# Altium footprint library tinyCamera.PcbLib: 101 footprints (part 4 of 7)
Each footprint in its own frame and in the unit in brackets; x right, y up, seen from the top. Pads: shape width x height; smd on the part's side, far side on the other; paste and mask are expansions set on the pad; w line width, h text height; cw(c..) or ccw(c..) is an arc to the next point about the centre after c.
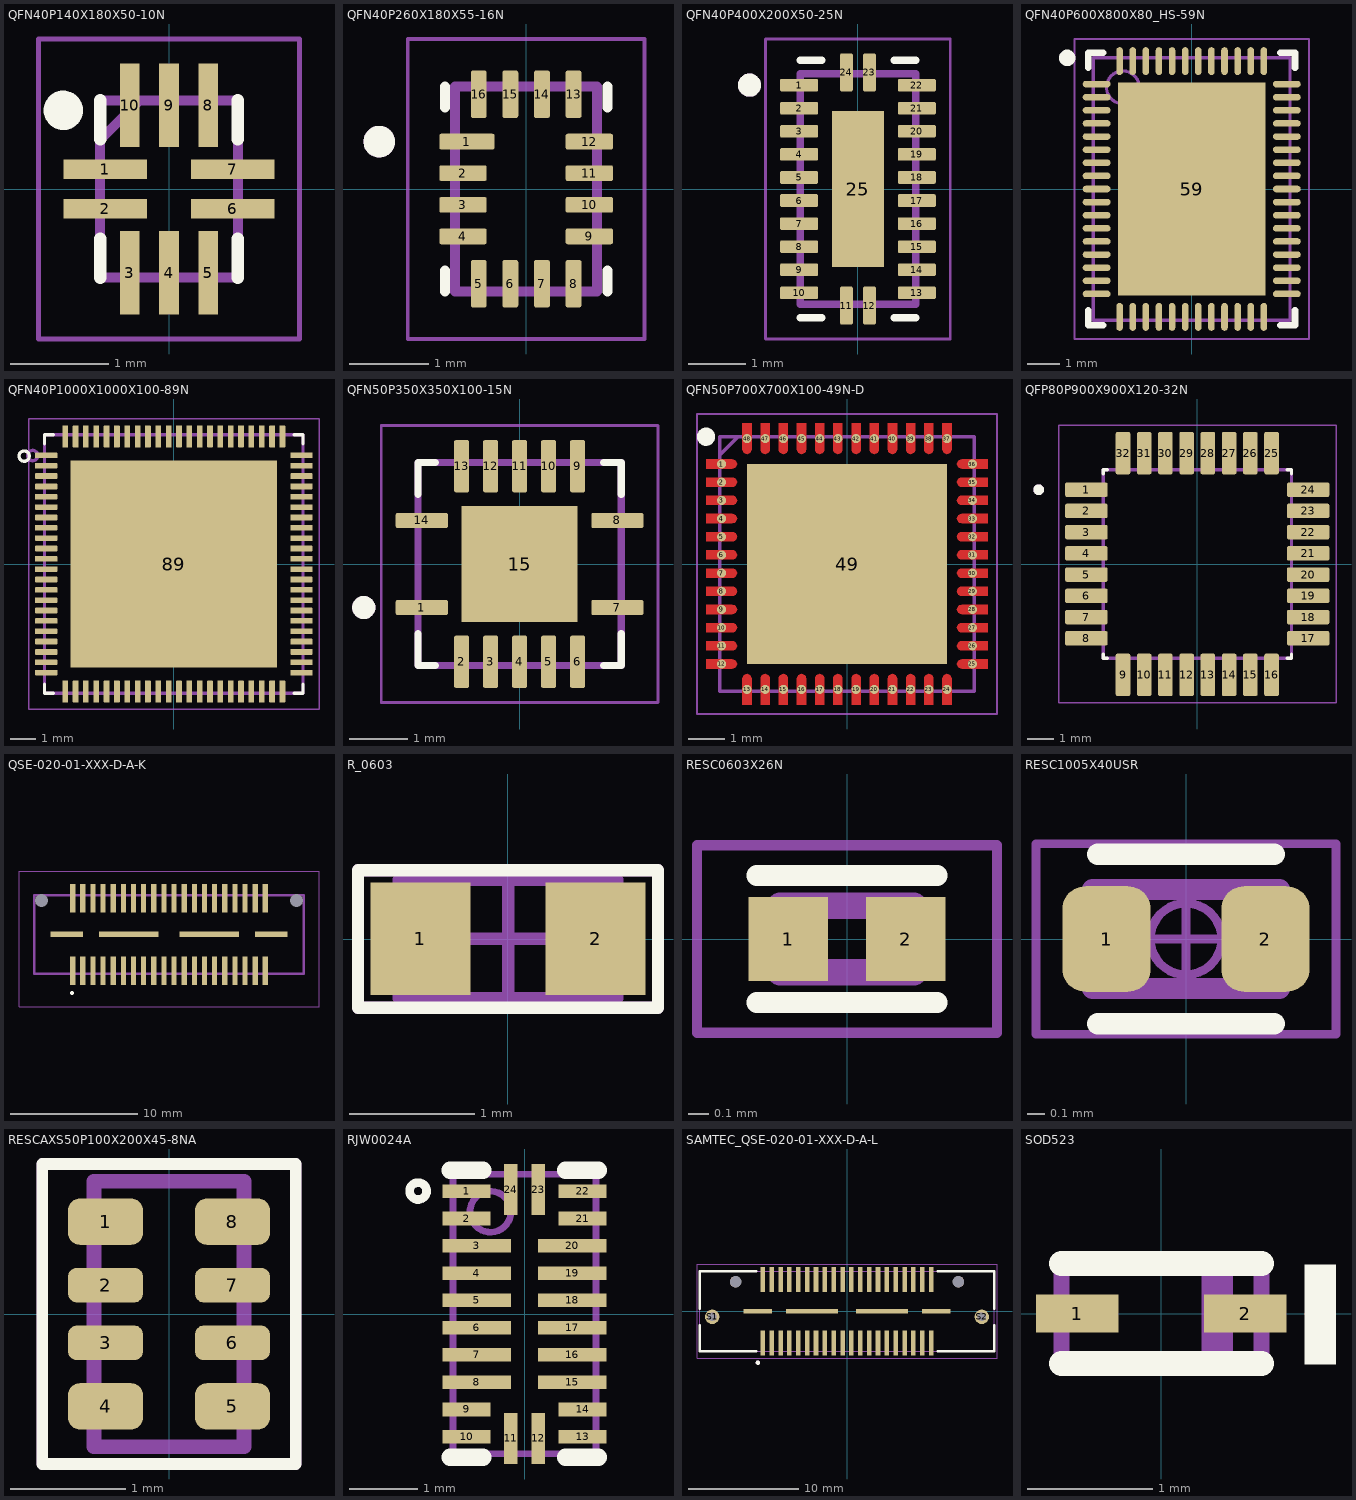
[diagram p3: the footprints below, top view; thin cyan lines are the x and y axes]

## QFN40P140X180X50-10N [mm]
pads (10):
  rect 0.85x0.2 smd mask+0.051: 1(-0.65,0.2) 2(-0.65,-0.2) 6(0.65,-0.2) 7(0.65,0.2)
  rect 0.2x0.85 smd mask+0.051: 3(-0.4,-0.85) 4(0,-0.85) 5(0.4,-0.85) 8(0.4,0.85) 9(0,0.85) 10(-0.4,0.85)
Top Overlay:
  circle w0.2: c-1.075,0.8 r0.1
  lines w0.127: -0.7,-0.9 -0.7,-0.508 ; -0.7,0.508 -0.7,0.9 ; 0.7,-0.9 0.7,-0.508 ; 0.7,0.508 0.7,0.9
Mechanical 13:
  lines w0.1: -0.7,0.5 -0.3,0.9 ; -0.7,-0.9 -0.7,0.9 0.7,0.9 0.7,-0.9 -0.7,-0.9
  text ".Designator" at -0.383,-0.157 h1.27
Mechanical 20:
  lines w0.05: -1.325,-1.525 1.325,-1.525 1.325,1.525 -1.325,1.525 -1.325,-1.525
3D body "74AVC1T1022GUX.stp": height 0.49, standoff 0.01, extent -0.7,-0.9 0.7,0.9

## QFN40P260X180X55-16N [mm]
pads (16):
  rrect25% 0.7x0.2 smd mask+0.051: 1(-0.75,0.6)
  rrect25% 0.6x0.2 smd mask+0.051: 2(-0.8,0.2) 3(-0.8,-0.2) 4(-0.8,-0.6) 9(0.8,-0.6) 10(0.8,-0.2) 11(0.8,0.2) 12(0.8,0.6)
  rrect25% 0.2x0.6 smd mask+0.051: 5(-0.6,-1.2) 6(-0.2,-1.2) 7(0.2,-1.2) 8(0.6,-1.2) 13(0.6,1.2) 14(0.2,1.2) 15(-0.2,1.2) 16(-0.6,1.2)
Top Overlay:
  circle w0.2: c-1.86,0.6 r0.1
  lines w0.127: -1.03,-1.3 -1.03,-1.03 ; -1.03,1.03 -1.03,1.3 ; 1.03,-1.3 1.03,-1.03 ; 1.03,1.03 1.03,1.3
Mechanical 13:
  circle w0.2: c-1.86,0.6 r0.1
  lines w0.127: -0.9,-1.3 -0.9,1.3 0.9,1.3 0.9,-1.3 -0.9,-1.3
  text ".Designator" at -0.24,-0.38 h1.27
Mechanical 15:
  lines w0.05: -1.5,-1.9 -1.5,1.9 1.5,1.9 1.5,-1.9 -1.5,-1.9
3D body "step_temp.STEP": height 0.55, standoff 0, extent -0.9,-1.3 0.9,1.3

## QFN40P400X200X50-25N [mm]
pads (25):
  rrect25% 0.66x0.22 smd mask+0.051: 1(-1.02,1.8) 2(-1.02,1.4) 3(-1.02,1) 4(-1.02,0.6) 5(-1.02,0.2) 6(-1.02,-0.2) 7(-1.02,-0.6) 8(-1.02,-1) 9(-1.02,-1.4) 10(-1.02,-1.8) 13(1.02,-1.8) 14(1.02,-1.4) 15(1.02,-1) 16(1.02,-0.6) 17(1.02,-0.2) 18(1.02,0.2) 19(1.02,0.6) 20(1.02,1) 21(1.02,1.4) 22(1.02,1.8)
  rrect25% 0.22x0.66 smd mask+0.051: 11(-0.2,-2.02) 12(0.2,-2.02) 23(0.2,2.02) 24(-0.2,2.02)
  rect 0.9x2.7 smd paste-2 mask+0.051: 25(0,0)
Top Overlay:
  circle w0.2: c-1.88,1.8 r0.1
  lines w0.127: -1,-2.23 -0.63,-2.23 ; -1,2.23 -0.63,2.23 ; 0.63,-2.23 1,-2.23 ; 0.63,2.23 1,2.23
Top Paste:
  region: -0.075,-0.825 -0.375,-0.825 -0.375,-0.525 -0.075,-0.525
  region: -0.075,-1.275 -0.375,-1.275 -0.375,-0.975 -0.075,-0.975
  region: 0.375,-1.275 0.075,-1.275 0.075,-0.975 0.375,-0.975
  region: 0.375,-0.825 0.075,-0.825 0.075,-0.525 0.375,-0.525
  region: 0.375,0.975 0.075,0.975 0.075,1.275 0.375,1.275
  region: 0.375,0.525 0.075,0.525 0.075,0.825 0.375,0.825
  region: -0.075,0.975 -0.375,0.975 -0.375,1.275 -0.075,1.275
  region: -0.075,0.525 -0.375,0.525 -0.375,0.825 -0.075,0.825
  region: -0.075,-0.375 -0.375,-0.375 -0.375,-0.075 -0.075,-0.075
  region: 0.375,-0.375 0.075,-0.375 0.075,-0.075 0.375,-0.075
  region: 0.375,0.075 0.075,0.075 0.075,0.375 0.375,0.375
  region: -0.075,0.075 -0.375,0.075 -0.375,0.375 -0.075,0.375
Mechanical 13:
  circle w0.2: c-1.88,1.8 r0.1
  lines w0.127: -1,-2 -1,2 1,2 1,-2 -1,-2
  text ".Designator" at -0.644,-0.31 h1.27
Mechanical 15:
  lines w0.05: -1.6,-2.6 -1.6,2.6 1.6,2.6 1.6,-2.6 -1.6,-2.6
3D body "step_temp.STEP": height 0.5, standoff 0, extent -1,-2 1,2

## QFN40P600X800X80_HS-59N [mm] "QFN, 58-Leads, Body 6.00x8.00mm, Pitch 0.40mm, Thermal Pad 4.50x6.50mm, IPC Medium Density"
height 0.8
pads (59):
  oval 0.85x0.2 smd: 1(-2.9,3.2) 2(-2.9,2.8) 3(-2.9,2.4) 4(-2.9,2) 5(-2.9,1.6) 6(-2.9,1.2) 7(-2.9,0.8) 8(-2.9,0.4) 9(-2.9,0) 10(-2.9,-0.4) 11(-2.9,-0.8) 12(-2.9,-1.2) 13(-2.9,-1.6) 14(-2.9,-2) 15(-2.9,-2.4) 16(-2.9,-2.8) 17(-2.9,-3.2) 30(2.9,-3.2) 31(2.9,-2.8) 32(2.9,-2.4) 33(2.9,-2) 34(2.9,-1.6) 35(2.9,-1.2) 36(2.9,-0.8) 37(2.9,-0.4) 38(2.9,0) 39(2.9,0.4) 40(2.9,0.8) 41(2.9,1.2) 42(2.9,1.6) 43(2.9,2) 44(2.9,2.4) 45(2.9,2.8) 46(2.9,3.2)
  oval 0.2x0.85 smd: 18(-2.2,-3.9) 19(-1.8,-3.9) 20(-1.4,-3.9) 21(-1,-3.9) 22(-0.6,-3.9) 23(-0.2,-3.9) 24(0.2,-3.9) 25(0.6,-3.9) 26(1,-3.9) 27(1.4,-3.9) 28(1.8,-3.9) 29(2.2,-3.9) 47(2.2,3.9) 48(1.8,3.9) 49(1.4,3.9) 50(1,3.9) 51(0.6,3.9) 52(0.2,3.9) 53(-0.2,3.9) 54(-0.6,3.9) 55(-1,3.9) 56(-1.4,3.9) 57(-1.8,3.9) 58(-2.2,3.9)
  rect 4.5x6.5 smd: 59(0,0)
Top Overlay:
  circle w0.25: c-3.8,4 r0.125
  lines w0.2: -3.15,-3.7 -3.15,-4.15 -2.7,-4.15 ; -3.15,3.7 -3.15,4.15 -2.7,4.15 ; 2.7,-4.15 3.15,-4.15 3.15,-3.7 ; 2.7,4.15 3.15,4.15 3.15,3.7
Top Courtyard:
  lines w0.05: -3.575,-4.575 3.575,-4.575 3.575,4.575 -3.575,4.575 -3.575,-4.575
  lines w0.1: -0.5,0 0.5,0 ; 0,-0.5 0,0.5
Mechanical 13:
  circle w0.1: c-2.1,3.1 r0.5
  lines w0.1: -3,-4 3,-4 3,4 -3,4 -3,-4
  text ".Designator" at -2.068,-0.367 h1.27
3D body "QFN40P600X800X80_HS-59N.step": height 0.8, standoff 0, extent -3.01,-4.01 3.01,4.01

## QFN40P1000X1000X100-89N [mm]
pads (89):
  rrect25% 0.86x0.22 smd mask+0.05: 1(-4.935,4.2) 2(-4.935,3.8) 3(-4.935,3.4) 4(-4.935,3) 5(-4.935,2.6) 6(-4.935,2.2) 7(-4.935,1.8) 8(-4.935,1.4) 9(-4.935,1) 10(-4.935,0.6) 11(-4.935,0.2) 12(-4.935,-0.2) 13(-4.935,-0.6) 14(-4.935,-1) 15(-4.935,-1.4) 16(-4.935,-1.8) 17(-4.935,-2.2) 18(-4.935,-2.6) 19(-4.935,-3) 20(-4.935,-3.4) 21(-4.935,-3.8) 22(-4.935,-4.2) 45(4.935,-4.2) 46(4.935,-3.8) 47(4.935,-3.4) 48(4.935,-3) 49(4.935,-2.6) 50(4.935,-2.2) 51(4.935,-1.8) 52(4.935,-1.4) 53(4.935,-1) 54(4.935,-0.6) 55(4.935,-0.2) 56(4.935,0.2) 57(4.935,0.6) 58(4.935,1) 59(4.935,1.4) 60(4.935,1.8) 61(4.935,2.2) 62(4.935,2.6) 63(4.935,3) 64(4.935,3.4) 65(4.935,3.8) 66(4.935,4.2)
  rrect25% 0.22x0.86 smd mask+0.05: 23(-4.2,-4.935) 24(-3.8,-4.935) 25(-3.4,-4.935) 26(-3,-4.935) 27(-2.6,-4.935) 28(-2.2,-4.935) 29(-1.8,-4.935) 30(-1.4,-4.935) 31(-1,-4.935) 32(-0.6,-4.935) 33(-0.2,-4.935) 34(0.2,-4.935) 35(0.6,-4.935) 36(1,-4.935) 37(1.4,-4.935) 38(1.8,-4.935) 39(2.2,-4.935) 40(2.6,-4.935) 41(3,-4.935) 42(3.4,-4.935) 43(3.8,-4.935) 44(4.2,-4.935) 67(4.2,4.935) 68(3.8,4.935) 69(3.4,4.935) 70(3,4.935) 71(2.6,4.935) 72(2.2,4.935) 73(1.8,4.935) 74(1.4,4.935) 75(1,4.935) 76(0.6,4.935) 77(0.2,4.935) 78(-0.2,4.935) 79(-0.6,4.935) 80(-1,4.935) 81(-1.4,4.935) 82(-1.8,4.935) 83(-2.2,4.935) 84(-2.6,4.935) 85(-3,4.935) 86(-3.4,4.935) 87(-3.8,4.935) 88(-4.2,4.935)
  rect 8x8 smd paste-4 mask+0.05: 89(0,0)
Top Overlay:
  circle w0.127: c-5.787,4.173 r0.2
  lines w0.127: -5,-4.65 -5,-5 -4.65,-5 ; -5,4.65 -5,5 -4.65,5 ; 4.65,-5 5,-5 5,-4.65 ; 4.65,5 5,5 5,4.65
Top Paste:
  region: 2.3,-2.3 0.34,-2.3 0.34,-0.34 2.3,-0.34
  region: -0.34,-2.3 -2.3,-2.3 -2.3,-0.34 -0.34,-0.34
  region: -0.34,0.34 -2.3,0.34 -2.3,2.3 -0.34,2.3
  region: 2.3,0.34 0.34,0.34 0.34,2.3 2.3,2.3
Mechanical 13:
  circle w0.127: c-5.46,4.194 r0.2
  lines w0.127: -5,-5 -5,5 5,5 5,-5 -5,-5
  text ".Designator" at -0.997,-0.392 h1.27
Mechanical 15:
  lines w0.05: -5.615,-5.615 -5.615,5.615 5.615,5.615 5.615,-5.615 -5.615,-5.615
3D body "User Library-QFN88.step": height 0.85, standoff -0.02, extent -5.01,-5.01 5.01,5.01

## QFN50P350X350X100-15N [mm]
pads (15):
  rrect25% 0.9x0.26 smd mask+0.051: 1(-1.685,-0.75) 7(1.685,-0.75) 8(1.685,0.75) 14(-1.685,0.75)
  rrect25% 0.26x0.9 smd mask+0.051: 2(-1,-1.685) 3(-0.5,-1.685) 4(0,-1.685) 5(0.5,-1.685) 6(1,-1.685) 9(1,1.685) 10(0.5,1.685) 11(0,1.685) 12(-0.5,1.685) 13(-1,1.685)
  rect 2x2 smd paste-2: 15(0,0)
Top Overlay:
  circle w0.2: c-2.685,-0.75 r0.1
  lines w0.127: -1.75,-1.2 -1.75,-1.75 -1.45,-1.75 ; -1.75,1.2 -1.75,1.75 -1.45,1.75 ; 1.45,-1.75 1.75,-1.75 1.75,-1.2 ; 1.45,1.75 1.75,1.75 1.75,1.2
Top Paste:
  region: 0.63,-0.63 -0.63,-0.63 -0.63,0.63 0.63,0.63
Mechanical 13:
  circle w0.2: c-2.685,-0.75 r0.1
  lines w0.127: -1.75,-1.75 1.75,-1.75 1.75,1.75 -1.75,1.75 -1.75,-1.75
  text ".Designator" at 0.587,-0.356 h1.27
Mechanical 15:
  lines w0.05: -2.385,-2.385 2.385,-2.385 2.385,2.385 -2.385,2.385 -2.385,-2.385
3D body "SN74LV4T125RGYR.STEP": height 1, standoff 0, extent -1.75,-1.75 1.75,1.75

## QFN50P700X700X100-49N-D [mm]
pads (49):
  round 0.25 smd mask+0: 1(-3.45,2.75) 2(-3.45,2.25) 3(-3.45,1.75) 4(-3.45,1.25) 5(-3.45,0.75) 6(-3.45,0.25) 7(-3.45,-0.25) 8(-3.45,-0.75) 9(-3.45,-1.25) 10(-3.45,-1.75) 11(-3.45,-2.25) 12(-3.45,-2.75) 13(-2.75,-3.45) 14(-2.25,-3.45) 15(-1.75,-3.45) 16(-1.25,-3.45) 17(-0.75,-3.45) 18(-0.25,-3.45) 19(0.25,-3.45) 20(0.75,-3.45) 21(1.25,-3.45) 22(1.75,-3.45) 23(2.25,-3.45) 24(2.75,-3.45) 25(3.45,-2.75) 26(3.45,-2.25) 27(3.45,-1.75) 28(3.45,-1.25) 29(3.45,-0.75) 30(3.45,-0.25) 31(3.45,0.25) 32(3.45,0.75) 33(3.45,1.25) 34(3.45,1.75) 35(3.45,2.25) 36(3.45,2.75) 37(2.75,3.45) 38(2.25,3.45) 39(1.75,3.45) 40(1.25,3.45) 41(0.75,3.45) 42(0.25,3.45) 43(-0.25,3.45) 44(-0.75,3.45) 45(-1.25,3.45) 46(-1.75,3.45) 47(-2.25,3.45) 48(-2.75,3.45)
  rrect0% 5.5x5.5 smd mask+0.051: 49(0,0)
Top Layer:
  region: -3.875,2.875 -3.15,2.876 -3.117,2.872 -3.087,2.859 -3.061,2.839 -3.041,2.813 -3.028,2.783 -3.024,2.75 -3.028,2.717 -3.041,2.687 -3.061,2.661 -3.087,2.641 -3.117,2.628 -3.15,2.624 -3.15,2.625 -3.875,2.625
  region: -3.875,2.375 -3.15,2.376 -3.117,2.372 -3.087,2.359 -3.061,2.339 -3.041,2.313 -3.028,2.283 -3.024,2.25 -3.028,2.217 -3.041,2.187 -3.061,2.161 -3.087,2.141 -3.117,2.128 -3.15,2.124 -3.15,2.125 -3.875,2.125
  region: -3.875,1.875 -3.15,1.876 -3.117,1.872 -3.087,1.859 -3.061,1.839 -3.041,1.813 -3.028,1.783 -3.024,1.75 -3.028,1.717 -3.041,1.687 -3.061,1.661 -3.087,1.641 -3.117,1.628 -3.15,1.624 -3.15,1.625 -3.875,1.625
  region: -3.875,1.375 -3.15,1.376 -3.117,1.372 -3.087,1.359 -3.061,1.339 -3.041,1.313 -3.028,1.283 -3.024,1.25 -3.028,1.217 -3.041,1.187 -3.061,1.161 -3.087,1.141 -3.117,1.128 -3.15,1.124 -3.15,1.125 -3.875,1.125
  region: -3.875,0.875 -3.15,0.876 -3.117,0.872 -3.087,0.859 -3.061,0.839 -3.041,0.813 -3.028,0.783 -3.024,0.75 -3.028,0.717 -3.041,0.687 -3.061,0.661 -3.087,0.641 -3.117,0.628 -3.15,0.624 -3.15,0.625 -3.875,0.625
  region: -3.875,0.375 -3.15,0.376 -3.117,0.372 -3.087,0.359 -3.061,0.339 -3.041,0.313 -3.028,0.283 -3.024,0.25 -3.028,0.217 -3.041,0.187 -3.061,0.161 -3.087,0.141 -3.117,0.128 -3.15,0.124 -3.15,0.125 -3.875,0.125
  region: -3.875,-0.125 -3.15,-0.124 -3.117,-0.128 -3.087,-0.141 -3.061,-0.161 -3.041,-0.187 -3.028,-0.217 -3.024,-0.25 -3.028,-0.283 -3.041,-0.313 -3.061,-0.339 -3.087,-0.359 -3.117,-0.372 -3.15,-0.376 -3.15,-0.375 -3.875,-0.375
  region: -3.875,-0.625 -3.15,-0.624 -3.117,-0.628 -3.087,-0.641 -3.061,-0.661 -3.041,-0.687 -3.028,-0.717 -3.024,-0.75 -3.028,-0.783 -3.041,-0.813 -3.061,-0.839 -3.087,-0.859 -3.117,-0.872 -3.15,-0.876 -3.15,-0.875 -3.875,-0.875
  region: -3.875,-1.125 -3.15,-1.124 -3.117,-1.128 -3.087,-1.141 -3.061,-1.161 -3.041,-1.187 -3.028,-1.217 -3.024,-1.25 -3.028,-1.283 -3.041,-1.313 -3.061,-1.339 -3.087,-1.359 -3.117,-1.372 -3.15,-1.376 -3.15,-1.375 -3.875,-1.375
  region: -3.875,-1.625 -3.15,-1.624 -3.117,-1.628 -3.087,-1.641 -3.061,-1.661 -3.041,-1.687 -3.028,-1.717 -3.024,-1.75 -3.028,-1.783 -3.041,-1.813 -3.061,-1.839 -3.087,-1.859 -3.117,-1.872 -3.15,-1.876 -3.15,-1.875 -3.875,-1.875
  region: -3.875,-2.125 -3.15,-2.124 -3.117,-2.128 -3.087,-2.141 -3.061,-2.161 -3.041,-2.187 -3.028,-2.217 -3.024,-2.25 -3.028,-2.283 -3.041,-2.313 -3.061,-2.339 -3.087,-2.359 -3.117,-2.372 -3.15,-2.376 -3.15,-2.375 -3.875,-2.375
  region: -3.875,-2.625 -3.15,-2.624 -3.117,-2.628 -3.087,-2.641 -3.061,-2.661 -3.041,-2.687 -3.028,-2.717 -3.024,-2.75 -3.028,-2.783 -3.041,-2.813 -3.061,-2.839 -3.087,-2.859 -3.117,-2.872 -3.15,-2.876 -3.15,-2.875 -3.875,-2.875
  region: -2.875,-3.875 -2.876,-3.15 -2.872,-3.117 -2.859,-3.087 -2.839,-3.061 -2.813,-3.041 -2.783,-3.028 -2.75,-3.024 -2.717,-3.028 -2.687,-3.041 -2.661,-3.061 -2.641,-3.087 -2.628,-3.117 -2.624,-3.15 -2.625,-3.15 -2.625,-3.875
  region: -2.375,-3.875 -2.376,-3.15 -2.372,-3.117 -2.359,-3.087 -2.339,-3.061 -2.313,-3.041 -2.283,-3.028 -2.25,-3.024 -2.217,-3.028 -2.187,-3.041 -2.161,-3.061 -2.141,-3.087 -2.128,-3.117 -2.124,-3.15 -2.125,-3.15 -2.125,-3.875
  region: -1.875,-3.875 -1.876,-3.15 -1.872,-3.117 -1.859,-3.087 -1.839,-3.061 -1.813,-3.041 -1.783,-3.028 -1.75,-3.024 -1.717,-3.028 -1.687,-3.041 -1.661,-3.061 -1.641,-3.087 -1.628,-3.117 -1.624,-3.15 -1.625,-3.15 -1.625,-3.875
  region: -1.375,-3.875 -1.376,-3.15 -1.372,-3.117 -1.359,-3.087 -1.339,-3.061 -1.313,-3.041 -1.283,-3.028 -1.25,-3.024 -1.217,-3.028 -1.187,-3.041 -1.161,-3.061 -1.141,-3.087 -1.128,-3.117 -1.124,-3.15 -1.125,-3.15 -1.125,-3.875
  region: -0.875,-3.875 -0.876,-3.15 -0.872,-3.117 -0.859,-3.087 -0.839,-3.061 -0.813,-3.041 -0.783,-3.028 -0.75,-3.024 -0.717,-3.028 -0.687,-3.041 -0.661,-3.061 -0.641,-3.087 -0.628,-3.117 -0.624,-3.15 -0.625,-3.15 -0.625,-3.875
  region: -0.375,-3.875 -0.376,-3.15 -0.372,-3.117 -0.359,-3.087 -0.339,-3.061 -0.313,-3.041 -0.283,-3.028 -0.25,-3.024 -0.217,-3.028 -0.187,-3.041 -0.161,-3.061 -0.141,-3.087 -0.128,-3.117 -0.124,-3.15 -0.125,-3.15 -0.125,-3.875
  region: 0.125,-3.875 0.124,-3.15 0.128,-3.117 0.141,-3.087 0.161,-3.061 0.187,-3.041 0.217,-3.028 0.25,-3.024 0.283,-3.028 0.313,-3.041 0.339,-3.061 0.359,-3.087 0.372,-3.117 0.376,-3.15 0.375,-3.15 0.375,-3.875
  region: 0.625,-3.875 0.624,-3.15 0.628,-3.117 0.641,-3.087 0.661,-3.061 0.687,-3.041 0.717,-3.028 0.75,-3.024 0.783,-3.028 0.813,-3.041 0.839,-3.061 0.859,-3.087 0.872,-3.117 0.876,-3.15 0.875,-3.15 0.875,-3.875
  region: 1.125,-3.875 1.124,-3.15 1.128,-3.117 1.141,-3.087 1.161,-3.061 1.187,-3.041 1.217,-3.028 1.25,-3.024 1.283,-3.028 1.313,-3.041 1.339,-3.061 1.359,-3.087 1.372,-3.117 1.376,-3.15 1.375,-3.15 1.375,-3.875
  region: 1.625,-3.875 1.624,-3.15 1.628,-3.117 1.641,-3.087 1.661,-3.061 1.687,-3.041 1.717,-3.028 1.75,-3.024 1.783,-3.028 1.813,-3.041 1.839,-3.061 1.859,-3.087 1.872,-3.117 1.876,-3.15 1.875,-3.15 1.875,-3.875
  region: 2.125,-3.875 2.124,-3.15 2.128,-3.117 2.141,-3.087 2.161,-3.061 2.187,-3.041 2.217,-3.028 2.25,-3.024 2.283,-3.028 2.313,-3.041 2.339,-3.061 2.359,-3.087 2.372,-3.117 2.376,-3.15 2.375,-3.15 2.375,-3.875
  region: 2.625,-3.875 2.624,-3.15 2.628,-3.117 2.641,-3.087 2.661,-3.061 2.687,-3.041 2.717,-3.028 2.75,-3.024 2.783,-3.028 2.813,-3.041 2.839,-3.061 2.859,-3.087 2.872,-3.117 2.876,-3.15 2.875,-3.15 2.875,-3.875
  region: 3.875,-2.875 3.15,-2.876 3.117,-2.872 3.087,-2.859 3.061,-2.839 3.041,-2.813 3.028,-2.783 3.024,-2.75 3.028,-2.717 3.041,-2.687 3.061,-2.661 3.087,-2.641 3.117,-2.628 3.15,-2.624 3.15,-2.625 3.875,-2.625
  region: 3.875,-2.375 3.15,-2.376 3.117,-2.372 3.087,-2.359 3.061,-2.339 3.041,-2.313 3.028,-2.283 3.024,-2.25 3.028,-2.217 3.041,-2.187 3.061,-2.161 3.087,-2.141 3.117,-2.128 3.15,-2.124 3.15,-2.125 3.875,-2.125
  region: 3.875,-1.875 3.15,-1.876 3.117,-1.872 3.087,-1.859 3.061,-1.839 3.041,-1.813 3.028,-1.783 3.024,-1.75 3.028,-1.717 3.041,-1.687 3.061,-1.661 3.087,-1.641 3.117,-1.628 3.15,-1.624 3.15,-1.625 3.875,-1.625
  region: 3.875,-1.375 3.15,-1.376 3.117,-1.372 3.087,-1.359 3.061,-1.339 3.041,-1.313 3.028,-1.283 3.024,-1.25 3.028,-1.217 3.041,-1.187 3.061,-1.161 3.087,-1.141 3.117,-1.128 3.15,-1.124 3.15,-1.125 3.875,-1.125
  region: 3.875,-0.875 3.15,-0.876 3.117,-0.872 3.087,-0.859 3.061,-0.839 3.041,-0.813 3.028,-0.783 3.024,-0.75 3.028,-0.717 3.041,-0.687 3.061,-0.661 3.087,-0.641 3.117,-0.628 3.15,-0.624 3.15,-0.625 3.875,-0.625
  region: 3.875,-0.375 3.15,-0.376 3.117,-0.372 3.087,-0.359 3.061,-0.339 3.041,-0.313 3.028,-0.283 3.024,-0.25 3.028,-0.217 3.041,-0.187 3.061,-0.161 3.087,-0.141 3.117,-0.128 3.15,-0.124 3.15,-0.125 3.875,-0.125
  region: 3.875,0.125 3.15,0.124 3.117,0.128 3.087,0.141 3.061,0.161 3.041,0.187 3.028,0.217 3.024,0.25 3.028,0.283 3.041,0.313 3.061,0.339 3.087,0.359 3.117,0.372 3.15,0.376 3.15,0.375 3.875,0.375
  region: 3.875,0.625 3.15,0.624 3.117,0.628 3.087,0.641 3.061,0.661 3.041,0.687 3.028,0.717 3.024,0.75 3.028,0.783 3.041,0.813 3.061,0.839 3.087,0.859 3.117,0.872 3.15,0.876 3.15,0.875 3.875,0.875
  region: 3.875,1.125 3.15,1.124 3.117,1.128 3.087,1.141 3.061,1.161 3.041,1.187 3.028,1.217 3.024,1.25 3.028,1.283 3.041,1.313 3.061,1.339 3.087,1.359 3.117,1.372 3.15,1.376 3.15,1.375 3.875,1.375
  region: 3.875,1.625 3.15,1.624 3.117,1.628 3.087,1.641 3.061,1.661 3.041,1.687 3.028,1.717 3.024,1.75 3.028,1.783 3.041,1.813 3.061,1.839 3.087,1.859 3.117,1.872 3.15,1.876 3.15,1.875 3.875,1.875
  region: 3.875,2.125 3.15,2.124 3.117,2.128 3.087,2.141 3.061,2.161 3.041,2.187 3.028,2.217 3.024,2.25 3.028,2.283 3.041,2.313 3.061,2.339 3.087,2.359 3.117,2.372 3.15,2.376 3.15,2.375 3.875,2.375
  region: 3.875,2.625 3.15,2.624 3.117,2.628 3.087,2.641 3.061,2.661 3.041,2.687 3.028,2.717 3.024,2.75 3.028,2.783 3.041,2.813 3.061,2.839 3.087,2.859 3.117,2.872 3.15,2.876 3.15,2.875 3.875,2.875
  region: 2.875,3.875 2.876,3.15 2.872,3.117 2.859,3.087 2.839,3.061 2.813,3.041 2.783,3.028 2.75,3.024 2.717,3.028 2.687,3.041 2.661,3.061 2.641,3.087 2.628,3.117 2.624,3.15 2.625,3.15 2.625,3.875
  region: 2.375,3.875 2.376,3.15 2.372,3.117 2.359,3.087 2.339,3.061 2.313,3.041 2.283,3.028 2.25,3.024 2.217,3.028 2.187,3.041 2.161,3.061 2.141,3.087 2.128,3.117 2.124,3.15 2.125,3.15 2.125,3.875
  region: 1.875,3.875 1.876,3.15 1.872,3.117 1.859,3.087 1.839,3.061 1.813,3.041 1.783,3.028 1.75,3.024 1.717,3.028 1.687,3.041 1.661,3.061 1.641,3.087 1.628,3.117 1.624,3.15 1.625,3.15 1.625,3.875
  region: 1.375,3.875 1.376,3.15 1.372,3.117 1.359,3.087 1.339,3.061 1.313,3.041 1.283,3.028 1.25,3.024 1.217,3.028 1.187,3.041 1.161,3.061 1.141,3.087 1.128,3.117 1.124,3.15 1.125,3.15 1.125,3.875
  region: 0.875,3.875 0.876,3.15 0.872,3.117 0.859,3.087 0.839,3.061 0.813,3.041 0.783,3.028 0.75,3.024 0.717,3.028 0.687,3.041 0.661,3.061 0.641,3.087 0.628,3.117 0.624,3.15 0.625,3.15 0.625,3.875
  region: 0.375,3.875 0.376,3.15 0.372,3.117 0.359,3.087 0.339,3.061 0.313,3.041 0.283,3.028 0.25,3.024 0.217,3.028 0.187,3.041 0.161,3.061 0.141,3.087 0.128,3.117 0.124,3.15 0.125,3.15 0.125,3.875
  region: -0.125,3.875 -0.124,3.15 -0.128,3.117 -0.141,3.087 -0.161,3.061 -0.187,3.041 -0.217,3.028 -0.25,3.024 -0.283,3.028 -0.313,3.041 -0.339,3.061 -0.359,3.087 -0.372,3.117 -0.376,3.15 -0.375,3.15 -0.375,3.875
  region: -0.625,3.875 -0.624,3.15 -0.628,3.117 -0.641,3.087 -0.661,3.061 -0.687,3.041 -0.717,3.028 -0.75,3.024 -0.783,3.028 -0.813,3.041 -0.839,3.061 -0.859,3.087 -0.872,3.117 -0.876,3.15 -0.875,3.15 -0.875,3.875
  region: -1.125,3.875 -1.124,3.15 -1.128,3.117 -1.141,3.087 -1.161,3.061 -1.187,3.041 -1.217,3.028 -1.25,3.024 -1.283,3.028 -1.313,3.041 -1.339,3.061 -1.359,3.087 -1.372,3.117 -1.376,3.15 -1.375,3.15 -1.375,3.875
  region: -1.625,3.875 -1.624,3.15 -1.628,3.117 -1.641,3.087 -1.661,3.061 -1.687,3.041 -1.717,3.028 -1.75,3.024 -1.783,3.028 -1.813,3.041 -1.839,3.061 -1.859,3.087 -1.872,3.117 -1.876,3.15 -1.875,3.15 -1.875,3.875
  region: -2.125,3.875 -2.124,3.15 -2.128,3.117 -2.141,3.087 -2.161,3.061 -2.187,3.041 -2.217,3.028 -2.25,3.024 -2.283,3.028 -2.313,3.041 -2.339,3.061 -2.359,3.087 -2.372,3.117 -2.376,3.15 -2.375,3.15 -2.375,3.875
  region: -2.625,3.875 -2.624,3.15 -2.628,3.117 -2.641,3.087 -2.661,3.061 -2.687,3.041 -2.717,3.028 -2.75,3.024 -2.783,3.028 -2.813,3.041 -2.839,3.061 -2.859,3.087 -2.872,3.117 -2.876,3.15 -2.875,3.15 -2.875,3.875
Top Overlay:
  circle w0.25: c-3.875,3.5 r0.125
Mechanical 13:
  lines w0.1: -3.5,3 -3,3.5 ; -3.5,-3.5 3.5,-3.5 3.5,3.5 -3.5,3.5 -3.5,-3.5
  text ".Designator" at -2.046,-0.477 h1.27
Mechanical 15:
  lines w0.05: -4.125,-4.125 4.125,-4.125 4.125,4.125 -4.125,4.125 -4.125,-4.125
3D body "ICE40UP5K-SG48I.stp": height 1, standoff 0, extent -3.55,-3.55 3.55,3.55

## QFP80P900X900X120-32N [mm]
pads (32):
  rrect25% 1.6x0.55 smd: 1(-4.18,2.8) 2(-4.18,2) 3(-4.18,1.2) 4(-4.18,0.4) 5(-4.18,-0.4) 6(-4.18,-1.2) 7(-4.18,-2) 8(-4.18,-2.8) 17(4.18,-2.8) 18(4.18,-2) 19(4.18,-1.2) 20(4.18,-0.4) 21(4.18,0.4) 22(4.18,1.2) 23(4.18,2) 24(4.18,2.8)
  rrect25% 0.55x1.6 smd: 9(-2.8,-4.18) 10(-2,-4.18) 11(-1.2,-4.18) 12(-0.4,-4.18) 13(0.4,-4.18) 14(1.2,-4.18) 15(2,-4.18) 16(2.8,-4.18) 25(2.8,4.18) 26(2,4.18) 27(1.2,4.18) 28(0.4,4.18) 29(-0.4,4.18) 30(-1.2,4.18) 31(-2,4.18) 32(-2.8,4.18)
Top Overlay:
  circle w0.2: c-5.98,2.8 r0.1
  lines w0.127: -3.55,-3.395 -3.55,-3.55 -3.395,-3.55 ; -3.55,3.395 -3.55,3.55 -3.395,3.55 ; 3.395,-3.55 3.55,-3.55 3.55,-3.395 ; 3.395,3.55 3.55,3.55 3.55,3.395
Mechanical 13:
  circle w0.2: c-5.98,2.8 r0.1
  lines w0.127: -3.55,-3.55 -3.55,3.55 3.55,3.55 3.55,-3.55 -3.55,-3.55
  text ".Designator" at 0.144,-0.293 h1.27
Mechanical 15:
  lines w0.05: -5.23,-5.23 -5.23,5.23 5.23,5.23 5.23,-5.23 -5.23,-5.23
3D body "ATSAMD21E16B-AUT.STEP": height 0.53, standoff -0.67, extent -4.5,-4.5 4.5,4.5

## QSE-020-01-XXX-D-A-K [mm]
pads (46):
  rect 0.41x2.27 smd: 1(-1277.6,-1272.865) 2(-1277.6,-1267.135) 3(-1276.8,-1272.865) 4(-1276.8,-1267.135) 5(-1276,-1272.865) 6(-1276,-1267.135) 7(-1275.2,-1272.865) 8(-1275.2,-1267.135) 9(-1274.4,-1272.865) 10(-1274.4,-1267.135) 11(-1273.6,-1272.865) 12(-1273.6,-1267.135) 13(-1272.8,-1272.865) 14(-1272.8,-1267.135) 15(-1272,-1272.865) 16(-1272,-1267.135) 17(-1271.2,-1272.865) 18(-1271.2,-1267.135) 19(-1270.4,-1272.865) 20(-1270.4,-1267.135) 21(-1269.6,-1272.865) 22(-1269.6,-1267.135) 23(-1268.8,-1272.865) 24(-1268.8,-1267.135) 25(-1268,-1272.865) 26(-1268,-1267.135) 27(-1267.2,-1272.865) 28(-1267.2,-1267.135) 29(-1266.4,-1272.865) 30(-1266.4,-1267.135) 31(-1265.6,-1272.865) 32(-1265.6,-1267.135) 33(-1264.8,-1272.865) 34(-1264.8,-1267.135) 35(-1264,-1272.865) 36(-1264,-1267.135) 37(-1263.2,-1272.865) 38(-1263.2,-1267.135) 39(-1262.4,-1272.865) 40(-1262.4,-1267.135)
  rect 2.54x0.43 smd: 41(-1278.065,-1270) 42(-1261.935,-1270)
  rect 4.7x0.43 smd: 43(-1273.175,-1270) 44(-1266.825,-1270)
  round 0.51 hole 1.02 unplated: 45(-1280.065,-1267.33) 46(-1259.935,-1267.33)
Top Overlay:
  circle w0.2: c-1277.65,-1274.615 r0.05
Mechanical 13:
  lines w0.2: -1280.635,-1273.11 -1280.635,-1266.89 -1259.365,-1266.89 -1259.365,-1273.11 -1280.635,-1273.11
Mechanical 15:
  lines w0.05: -1281.835,-1275.715 -1281.835,-1265 -1258.165,-1265 -1258.165,-1275.715 -1281.835,-1275.715

## R_0603 [mm] "Chip Capacitor, Body 1.6x0.8mm, IPC High Density"
height 1.3
pads (2):
  rect 0.8x0.9 smd: 1(-0.7,0) 2(0.7,0)
Top Overlay:
  lines w0.1: -1.2,-0.55 1.2,-0.55 1.2,0.55 -1.2,0.55 -1.2,-0.55
Mechanical 13:
  lines w0.1: -0.875,-0.475 -0.875,0.475 0.875,0.475 0.875,-0.475 -0.875,-0.475
  text ".Designator" at 1.285,-0.328 h0.76
Mechanical 15:
  lines w0.1: -0.475,0 0.475,0 ; 0,-0.475 0,0.475 ; -1.2,-0.55 1.2,-0.55 1.2,0.55 -1.2,0.55 -1.2,-0.55
3D body "RC0603N.stp": height 0.71, standoff 0, extent -0.8,-0.4 0.8,0.4
3D body "RC0603N.stp": height 0.71, standoff 0, extent -0.8,-0.4 0.8,0.4

## RESC0603X26N [mm]
pads (2):
  rect 0.38x0.4 smd mask+0.025: 1(-0.281,0) 2(0.281,0)
Top Overlay:
  lines w0.1: -0.432,-0.305 0.432,-0.305 ; -0.432,0.305 0.432,0.305
Mechanical 13:
  lines w0.127: -0.32,-0.16 0.32,-0.16 0.32,0.16 -0.32,0.16 -0.32,-0.16
  text ".Designator" at 0.671,-0.346 h1.27
Mechanical 15:
  lines w0.05: -0.718,-0.448 0.718,-0.448 0.718,0.448 -0.718,0.448 -0.718,-0.448
3D body "RE0201BRE0710KL.STEP": height 0.26, standoff 0, extent -0.3,-0.15 0.3,0.15

## RESC1005X40USR [mm] "Resistor, Chip; 1.00 mm L X 0.50 mm W X 0.40 mm H body"
height 0.4
pads (2):
  rrect52% 0.5x0.6 smd mask+0.051: 1(-0.45,0) 2(0.45,0)
Top Overlay:
  lines w0.12: -0.5,-0.48 0.5,-0.48 ; -0.5,0.48 0.5,0.48
Mechanical 13:
  lines w0.12: -0.53,-0.28 -0.53,0.28 0.53,0.28 0.53,-0.28 -0.53,-0.28
  text ".Designator" at 0.911,-0.522 h1.27
Mechanical 15:
  circle w0.05: c0,0 r0.202
  lines w0.05: -0.27,0 0.27,0 ; 0,-0.27 0,0.27 ; -0.85,-0.54 -0.85,0.54 0.85,0.54 0.85,-0.54 -0.85,-0.54
3D body "RESC1005X40USR.STEP": height 0.4, standoff 0, extent -0.5,-0.25 0.5,0.25

## RESCAXS50P100X200X45-8NA [mm] "2 Side, Convex"
height 0.45
pads (8):
  rrect50% 0.65x0.4 smd mask+0.051: 1(-0.55,0.8) 4(-0.55,-0.8) 5(0.55,-0.8) 8(0.55,0.8)
  rrect50% 0.65x0.3 smd mask+0.051: 2(-0.55,0.25) 3(-0.55,-0.25) 6(0.55,-0.25) 7(0.55,0.25)
Top Overlay:
  lines w0.1: -1.1,-1.3 -1.1,1.3 1.1,1.3 1.1,-1.3 -1.1,-1.3
Mechanical 13:
  lines w0.127: -0.65,-1.15 0.65,-1.15 0.65,1.15 -0.65,1.15 -0.65,-1.15
  text ".Designator" at 0.4,-1.025 h1.27
Mechanical 15:
  lines w0.1: -1.1,-1.3 1.1,-1.3 1.1,1.3 -1.1,1.3 -1.1,-1.3
3D body: height 0.45, standoff 0, extent -0.65,-1.15 0.65,1.15

## RJW0024A [mm]
pads (24):
  rect 0.7x0.2 smd paste-0.337 mask+0: 1(-0.85,1.8) 2(-0.85,1.4) 9(-0.85,-1.4) 10(-0.85,-1.8) 13(0.85,-1.8) 14(0.85,-1.4) 21(0.85,1.4) 22(0.85,1.8)
  rect 1x0.2 smd paste-0.487 mask+0: 3(-0.7,1) 4(-0.7,0.6) 5(-0.7,0.2) 6(-0.7,-0.2) 7(-0.7,-0.6) 8(-0.7,-1) 15(0.7,-1) 16(0.7,-0.6) 17(0.7,-0.2) 18(0.7,0.2) 19(0.7,0.6) 20(0.7,1)
  rect 0.2x0.75 smd paste-0.362 mask+0: 11(-0.2,-1.825) 12(0.2,-1.825) 23(0.2,1.825) 24(-0.2,1.825)
Top Overlay:
  circle w0.127: c-1.561,1.803 r0.124
  lines w0.254: -1.092,-2.099 -0.61,-2.099 ; -1.092,2.108 -0.61,2.108 ; 0.601,-2.099 1.084,-2.099 ; 0.601,2.108 1.084,2.108
Top Paste:
  drawing of 24 lines, arcs and shapes, not listed
Mechanical 13:
  circle w0.1: c-0.5,1.5 r0.3
  lines w0.1: -1.05,-2.05 -1.05,2.05 1.05,2.05 1.05,-2.05 -1.05,-2.05
  text ".Designator" at -0.735,0.7 h1.27
3D body "RJW0024A.stp": height 0.55, standoff 0, extent -1,-2 1,2

## SAMTEC_QSE-020-01-XXX-D-A-L [mm]
pads (48):
  rect 0.41x2.27 smd: 01(-7.6,-2.865) 02(-7.6,2.865) 03(-6.8,-2.865) 04(-6.8,2.865) 05(-6,-2.865) 06(-6,2.865) 07(-5.2,-2.865) 08(-5.2,2.865) 09(-4.4,-2.865) 10(-4.4,2.865) 11(-3.6,-2.865) 12(-3.6,2.865) 13(-2.8,-2.865) 14(-2.8,2.865) 15(-2,-2.865) 16(-2,2.865) 17(-1.2,-2.865) 18(-1.2,2.865) 19(-0.4,-2.865) 20(-0.4,2.865) 21(0.4,-2.865) 22(0.4,2.865) 23(1.2,-2.865) 24(1.2,2.865) 25(2,-2.865) 26(2,2.865) 27(2.8,-2.865) 28(2.8,2.865) 29(3.6,-2.865) 30(3.6,2.865) 31(4.4,-2.865) 32(4.4,2.865) 33(5.2,-2.865) 34(5.2,2.865) 35(6,-2.865) 36(6,2.865) 37(6.8,-2.865) 38(6.8,2.865) 39(7.6,-2.865) 40(7.6,2.865)
  rect 2.54x0.43 smd: G1(-8.065,0) G4(8.065,0)
  rect 4.7x0.43 smd: G2(-3.175,0) G3(3.175,0)
  round 1.308 hole 0.8: S1(-12.18,-0.505) S2(12.18,-0.505)
  round 1.02 hole 1.02 unplated: ""(-10.065,2.665) ""(10.065,2.665)
Top Overlay:
  circle w0.2: c-8.05,-4.65 r0.1
  lines w0.2: -13.305,-1.25 -13.305,-3.62 -8.2,-3.62 ; -13.305,0.2 -13.305,3.62 -8.2,3.62 ; 8.2,-3.62 13.305,-3.62 13.305,-1.25 ; 8.2,3.62 13.305,3.62 13.305,0.2
Top Paste:
  circle w1.015: c12.18,-0.505 r0.507
  circle w1.015: c-12.18,-0.505 r0.507
Mechanical 13:
  circle w0.2: c-8.05,-4.65 r0.1
  lines w0.1: -13.305,-3.62 13.305,-3.62 13.305,3.62 -13.305,3.62 -13.305,-3.62
  text ".Designator" at -0.372,-0.367 h1.27
Mechanical 15:
  lines w0.05: -13.555,-4.25 13.555,-4.25 13.555,4.25 -13.555,4.25 -13.555,-4.25
3D body "QSE-020-01-F-D-A-K.stp": height 3.43, standoff -0.71, extent -10.643,-4.115 10.643,4.127

## SOD523 [mil]
pads (2):
  rect 26x12 smd mask+2.01: 1(-26.5,0) 2(26.5,0)
Top Overlay:
  rectangle: 45.03,-16.06 55.03,15.44
  lines w7.87: -31.5,-15.75 31.5,-15.75 ; -31.5,15.75 31.5,15.75
Mechanical 13:
  rectangle: 12.61,-15.75 22.61,15.75
  lines w5: -31.5,-15.75 31.5,-15.75 31.5,15.75 -31.5,15.75 -31.5,-15.75
  text ".designator" at 45.96,-15.75 h40
3D body "User Library-SOD-523F.STEP": height 26.56, standoff -1, extent -31.5,-15.7 31.5,15.7